# Altium schematic symbol library Semi-ATE.SchLib: 322 symbols (part 5 of 6) (continued)
## RES1A_41 (continued)
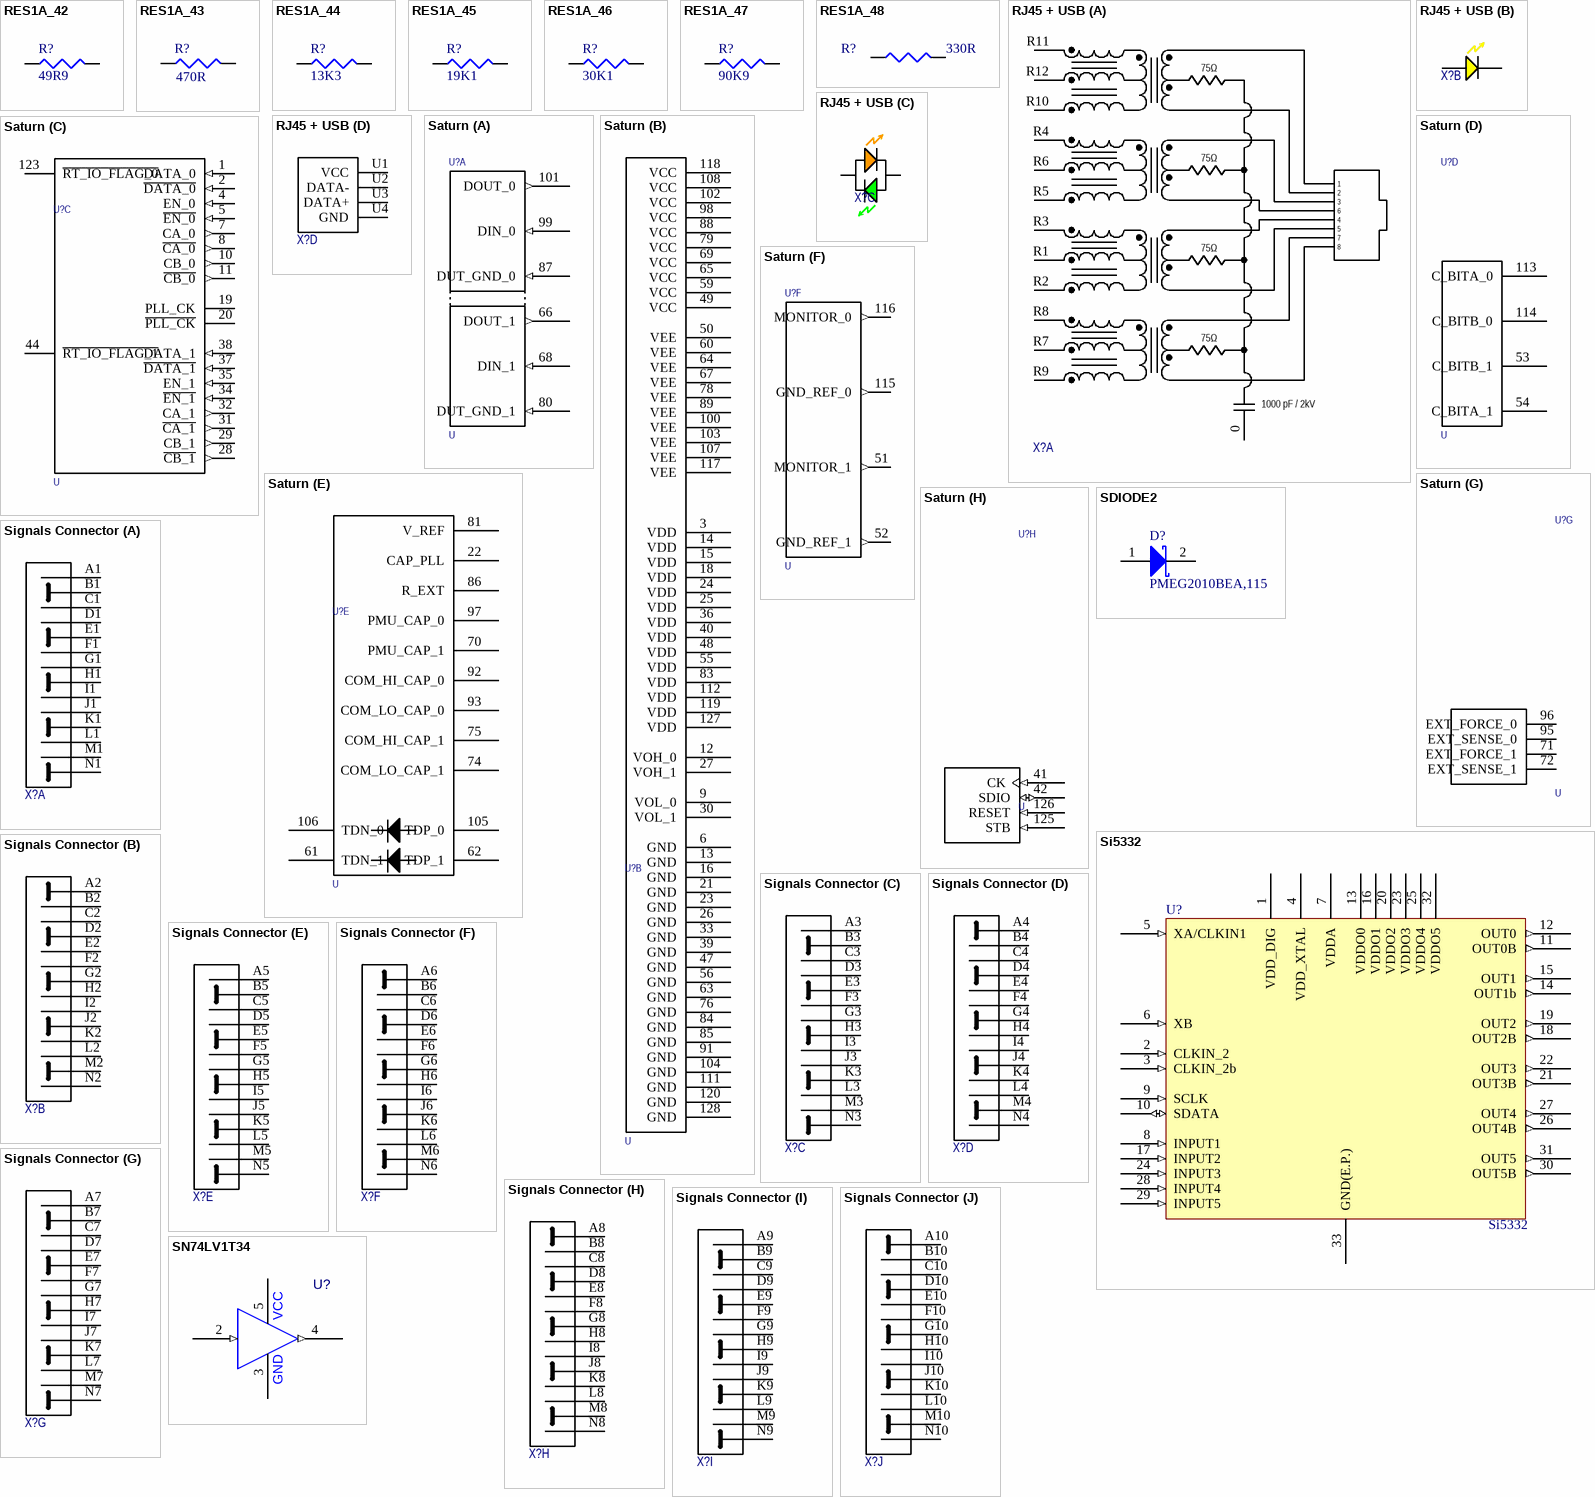
[diagram p13: symbols RES1A_42 to SN74LV1T34]

## RES1A_42
designator R?, comment value 49R9  (hidden comment: R)
RES SMD 49.9 OHM 1% 1/16W 0402; 04. Manufacturer: Yageo; 07. Manufacturer  Part Number: RC0402FR-0749R9L; POPULATED: yes; Parameters: 1/16W, 50V, 1%; 03. Unit Price: 0.09; Voltage Rating: 50V; 3D-Export: No; 01. Distributor: DigiKey; 02. Distributor Part Number: 311-49.9LRDKR-ND; 09. Operating Temperature: -55°C ~ 155°C; 11. RoHS: YES; Temperature Range: -55°C/+125°C; Power Rating: 1/16W; Tolerance: ±1%; Type: Thick Film; ComponentLink4Description: Info; ComponentLink4URL: https://www.digikey.de/product-detail/en/yageo/RC0402FR-0749R9L/311-49.9LRDKR-ND/732515; ComponentLink5Description: DataSheet; ComponentLink5URL: http://www.yageo.com/documents/recent/PYu-RC_Group_51_RoHS_L_10.pdf
footprint R0402 (Chip Resistor, Body 1.1x0.5mm (LxW typ), IPC High Density)
footprint R0603 (Chip Resistor, Body 1.6x0.8mm (LxW typ), IPC High Density)
footprint R0805 (Chip Resistor, Body 2.0x1.3mm (LxW typ), IPC High Density)
footprint R1206 (Chip Resistor, Body 3.2x1.6mm (LxW typ), IPC High Density)
footprint R1210 (Chip Resistor, Body 3.2x2.5mm (LxW typ), IPC High Density)
footprint R2010 (Chip Resistor, Body 5.0x2.5mm (LxW typ), IPC High Density)
footprint R2512 (Chip Resistor, Body 6.3x3.2mm (LxW typ), IPC High Density)
footprint R0402 Reflow
pins: 1, 2

## RES1A_43
designator R?, comment value 470R  (hidden comment: R)
RES SMD 470 OHM 1% 1/10W 0603; 04. Manufacturer: Yageo; 07. Manufacturer  Part Number: RC0603FR-07470RL; POPULATED: yes; Parameters: 1/10W, 50V, 1%; 03. Unit Price: 0.09; Voltage Rating: 50V; 3D-Export: No; 01. Distributor: DigiKey; 02. Distributor Part Number: 311-470HRDKR-ND; 09. Operating Temperature: -55°C ~ 155°C; 11. RoHS: YES; Temperature Range: -55°C/+125°C; Power Rating: 1/10W; Tolerance: ±1%; Type: Thick Film; ComponentLink4Description: Info; ComponentLink4URL: https://www.digikey.de/product-detail/en/yageo/RC0603FR-07470RL/311-470HRDKR-ND/733150; ComponentLink5Description: DataSheet; ComponentLink5URL: http://www.yageo.com/documents/recent/PYu-RC_Group_51_RoHS_L_10.pdf
footprint R0603 (Chip Resistor, Body 1.6x0.8mm (LxW typ), IPC High Density)
footprint R0603 Reflow
pins: 1, 2

## RES1A_44
designator R?, comment value 13K3  (hidden comment: R)
RES SMD 13.3K OHM 1% 1/16W 0402; 04. Manufacturer: Yageo; 07. Manufacturer  Part Number: RC0402FR-0713K3L; POPULATED: yes; Parameters: 1/16W, 50V, 1%; 03. Unit Price: 0.09; Voltage Rating: 50V; 3D-Export: No; 01. Distributor: DigiKey; 02. Distributor Part Number: YAG2974DKR-ND; 09. Operating Temperature: -55°C ~ 155°C; 11. RoHS: YES; Power Rating: 1/16W; Temperature Range: -55°C/+125°C; Tolerance: ±1%; Type: Thick Film; ComponentLink4Description: Info; ComponentLink4URL: https://www.digikey.de/product-detail/en/yageo/RC0402FR-0713K3L/YAG2974DKR-ND/5282845
footprint R0603 (Chip Resistor, Body 1.6x0.8mm (LxW typ), IPC High Density)
footprint R0402
footprint R0402 Reflow
pins: 1, 2

## RES1A_45
designator R?, comment value 19K1  (hidden comment: R)
RES SMD 19.1K OHM 1% 1/16W 0402; 04. Manufacturer: Yageo; 07. Manufacturer  Part Number: RC0402FR-0719K1L; POPULATED: yes; Parameters: 1/16W, 50V, 1%; 03. Unit Price: 0.09; Voltage Rating: 50V; 3D-Export: No; 01. Distributor: DigiKey; 02. Distributor Part Number: 311-19.1KLRDKR-ND; 09. Operating Temperature: -55°C ~ 155°C; 11. RoHS: YES; Power Rating: 1/16W; Temperature Range: -55°C/+125°C; Tolerance: ±1%; Type: Thick Film; ComponentLink4Description: Info; ComponentLink4URL: https://www.digikey.de/product-detail/en/yageo/RC0402FR-0719K1L/311-19.1KLRDKR-ND/732446
footprint R0603 (Chip Resistor, Body 1.6x0.8mm (LxW typ), IPC High Density)
footprint R0402
footprint R0402 Reflow
pins: 1, 2

## RES1A_46
designator R?, comment value 30K1  (hidden comment: R)
RES SMD 30.1K OHM 1% 1/16W 0402; 04. Manufacturer: Yageo; 07. Manufacturer  Part Number: RC0402FR-0730K1L; POPULATED: yes; Parameters: 1/16W, 50V, 1%; 03. Unit Price: 0.09; Voltage Rating: 50V; 3D-Export: No; 01. Distributor: DigiKey; 02. Distributor Part Number: 311-30.1KLRDKR-ND; 09. Operating Temperature: -55°C ~ 155°C; 11. RoHS: YES; Power Rating: 1/16W; Temperature Range: -55°C/+125°C; Tolerance: ±1%; Type: Thick Film; ComponentLink4Description: Info; ComponentLink4URL: https://www.digikey.de/product-detail/en/yageo/RC0402FR-0730K1L/311-30.1KLRDKR-ND/732481
footprint R0603 (Chip Resistor, Body 1.6x0.8mm (LxW typ), IPC High Density)
footprint R0402
footprint R0402 Reflow
pins: 1, 2

## RES1A_47
designator R?, comment value 90K9  (hidden comment: R)
RES SMD 90.9K OHM 1% 1/16W 0402; 04. Manufacturer: Yageo; 07. Manufacturer  Part Number: RC0402FR-0790K9L; POPULATED: yes; Parameters: 1/16W, 50V, 1%; 03. Unit Price: 0.09; Voltage Rating: 50V; 3D-Export: No; 01. Distributor: DigiKey; 02. Distributor Part Number: 311-90.9KLRDKR-ND; 09. Operating Temperature: -55°C ~ 155°C; 11. RoHS: YES; Power Rating: 1/16W; Temperature Range: -55°C/+125°C; Tolerance: ±1%; Type: Thick Film; ComponentLink4Description: Info; ComponentLink4URL: https://www.digikey.de/product-detail/en/yageo/RC0402FR-0790K9L/311-90.9KLRDKR-ND/732564
footprint R0603 (Chip Resistor, Body 1.6x0.8mm (LxW typ), IPC High Density)
footprint R0402
footprint R0402 Reflow
pins: 1, 2

## RES1A_48
designator R?, comment value 330R  (hidden comment: R)
RES SMD 330 OHM 1% 1/16W 0402; MFR: VISHAY; MFR-TYPE: D/CRCW e3; 04. Manufacturer: Yageo; 07. Manufacturer  Part Number: RC0402FR-07330RL; POPULATED: yes; Parameters: 1/16W, 50V, 1%; PackageHeight: 0.4mm; 03. Unit Price: 0.09; Voltage Rating: 50V; 3D-Export: No; 01. Distributor: DigiKey; 02. Distributor Part Number: 311-330LRDKR-ND; 09. Operating Temperature: -55°C ~ 155°C; 11. RoHS: YES; Power Rating: 1/16W; Temperature Range: -55°C/+125°C; Tolerance: ±1%; Type: Thick Film; ComponentLink4Description: Info; ComponentLink4URL: https://www.digikey.de/product-detail/en/yageo/RC0402FR-07330RL/311-330LRDKR-ND/732488; ComponentLink5Description: DataSheet; ComponentLink5URL: http://www.yageo.com/documents/recent/PYu-RC_Group_51_RoHS_L_10.pdf
footprint R0402 (Chip Resistor, Body 1.1x0.5mm (LxW typ), IPC High Density)
footprint R0603 (Chip Resistor, Body 1.6x0.8mm (LxW typ), IPC High Density)
footprint R0805 (Chip Resistor, Body 2.0x1.3mm (LxW typ), IPC High Density)
footprint R1206 (Chip Resistor, Body 3.2x1.6mm (LxW typ), IPC High Density)
footprint R1210 (Chip Resistor, Body 3.2x2.5mm (LxW typ), IPC High Density)
footprint R2010 (Chip Resistor, Body 5.0x2.5mm (LxW typ), IPC High Density)
footprint R2512 (Chip Resistor, Body 6.3x3.2mm (LxW typ), IPC High Density)
footprint R0402 Reflow
pins: 1, 2

## RJ45 + USB
designator X?, comment X  (value not drawn)
CONN MGJK 1PRT W/USB 1000 BASE-T; 04. Manufacturer: Amphenol Commercial Products; 07. Manufacturer  Part Number: RJMG233022610ER; 03. Unit Price: 5.06; 13. Created Date/Name: SEP 2018 / Hören; 3D-Export: Yes; 01. Distributor: DigiKey; 02. Distributor Part Number: RJMG233022610ER-ND; 09. Operating Temperature: 0°C ~ 70°C; 11. RoHS: YES; ComponentLink1Description: Info; ComponentLink1URL: https://www.digikey.de/product-detail/en/amphenol-commercial-products/RJMG233022610ER/RJMG233022610ER-ND/5359808; ComponentLink2Description: DataSheet; ComponentLink2URL: https://cdn.amphenol-icc.com/media/wysiwyg/files/documentation/datasheet/inputoutput/io_rjmag.pdf; ComponentLink4Description: Drawing; ComponentLink4URL: https://www.amphenol-icc.com/media/wysiwyg/files/drawing/rjmg233022610er.pdf
footprint RJMG233022610ER (RJ45 + USB)
part A pins: 0 GND, R1, R2, R3, R4, R5, R6, R7, R8, R9, R10, R11, R12
part B pins: L1, L2
part C pins: L3, L4
part D pins: U1 VCC, U2 DATA-, U3 DATA+, U4 GND
part A text: 75Ω; 1; 2; 3; 6; 4; 5; 7; 8; 1000 pF / 2kV

## Saturn
designator U?, comment U
Dual Channel, DCL + PMU (24V/75MHz); 04. Manufacturer: ElevATE; 07. Manufacturer  Part Number: ISL55188-AS; 03. Unit Price: 85.0; 05. Quantity: 1; 13. Created Date/Name: AUG 2018 / Hören; 3D-Export: Yes; ComponentLink1Description: Info; 01. Distributor: ElevATE; 02. Distributor Part Number: ISL55188-AS; 09. Operating Temperature: -55°C ~ 150°C; ComponentLink2Description: DataSheet
footprint Q128.14x20B
part A pins: 66 DOUT_1 (out), 68 DIN_1 (in), 80 DUT_GND_1 (in), 87 DUT_GND_0 (in), 99 DIN_0 (in), 101 DOUT_0 (out)
part B pins: 3 VDD (power), 6 GND (power), 9 VOL_0 (power), 12 VOH_0 (power), 13 GND (power), 14 VDD (power), 15 VDD (power), 16 GND (power), 18 VDD (power), 21 GND (power), 23 GND (power), 24 VDD (power), 25 VDD (power), 26 GND (power), 27 VOH_1 (power), 30 VOL_1 (power), 33 GND (power), 36 VDD (power), 39 GND (power), 40 VDD (power), 47 GND (power), 48 VDD (power), 49 VCC (power), 50 VEE (power), 55 VDD (power), 56 GND (power), 59 VCC (power), 60 VEE (power), 63 GND (power), 64 VEE (power), 65 VCC (power), 67 VEE (power), 69 VCC (power), 76 GND (power), 78 VEE (power), 79 VCC (power), 83 VDD (power), 84 GND (power), 85 GND (power), 88 VCC (power), 89 VEE (power), 91 GND (power), 98 VCC (power), 100 VEE (power), 102 VCC (power), 103 VEE (power), 104 GND (power), 107 VEE (power), 108 VCC (power), 111 GND (power), 112 VDD (power), 117 VEE (power), 118 VCC (power), 119 VDD (power), 120 GND (power), 127 VDD (power), 128 GND (power)
part C pins: 1 DATA_0 (in), 2 ~{DATA_0} (in) "DATA*_0", 4 EN_0 (in), 5 ~{EN_0} (in) "EN*_0", 7 CA_0 (out), 8 ~{CA_0} (out) "CA*_0", 10 CB_0 (out), 11 ~{CB_0} (out) "CB*_0", 19 PLL_CK, 20 ~{PLL_CK} "PLL_CK*", 28 ~{CB_1} (out) "CB*_1", 29 CB_1 (out), 31 ~{CA_1} (out) "CA*_1", 32 CA_1 (out), 34 ~{EN_1} (in) "EN*_1", 35 EN_1 (in), 37 ~{DATA_1} (in) "DATA*_1", 38 DATA_1 (in), 44 ~{RT_IO_FLAG_1} (oc) "RT_IO_FLAG*_1", 123 ~{RT_IO_FLAG_0} (oc) "RT_IO_FLAG*_0"
part D pins: 53 C_BITB_1 (oc), 54 C_BITA_1 (oc), 113 C_BITA_0 (oc), 114 C_BITB_0 (oc)
part E pins: 22 CAP_PLL, 61 TDN_1, 62 TDP_1, 70 PMU_CAP_1, 74 COM_LO_CAP_1, 75 COM_HI_CAP_1, 81 V_REF, 86 R_EXT, 92 COM_HI_CAP_0, 93 COM_LO_CAP_0, 97 PMU_CAP_0, 105 TDP_0, 106 TDN_0
part F pins: 51 MONITOR_1 (out), 52 GND_REF_1 (out), 115 GND_REF_0 (out), 116 MONITOR_0 (out)
part G pins: 71 EXT_FORCE_1, 72 EXT_SENSE_1, 95 EXT_SENSE_0, 96 EXT_FORCE_0
part H pins: 41 CK (in), 42 SDIO (io), 125 STB (in), 126 RESET (in)

## SDIODE2
designator D?, comment 07. Manufacturer  Part Number: PMEG2010BEA,115  (hidden comment: D)
DIODE SCHOTTKY 20V 1A SOD323; MFR: NXP; MFR-PN: PMEG2010BEA; 04. Manufacturer: Nexperia USA Inc.; POPULATED: yes; 03. Unit Price: 0.35; 3D-Export: No; 01. Distributor: DigiKey; 02. Distributor Part Number: 1727-5823-6-ND; 09. Operating Temperature: -65°C ~ 150°C; 11. RoHS: YES; ComponentLink4Description: Info; ComponentLink4URL: https://www.digikey.de/products/en/discrete-semiconductor-products/diodes-rectifiers-single/280?k=PMEG2010BEA&k=&pkeyword=PMEG2010BEA&sv=0&pv7=243&sf=0&quantity=&ColumnSort=0&page=1&pageSize=25; ComponentLink5Description: DataSheet; ComponentLink5URL: https://assets.nexperia.com/documents/data-sheet/PMEGXX10BEA_PMEGXX10BEV.pdf
footprint SOD323 (Footprint not found)
pins: 1 A, 2 K

## Si5332
designator U?, comment NicName: Si5332  (hidden comment: U)
IC CLK GENERATION (Any-Frequency Clock Generator) 32QFN; MFR-PN: Si5332E-D-GM1; MFR: SiLabs; 04. Manufacturer: Silicon Labs; POPULATED: yes; 03. Unit Price: 9.36; 3D-Export: No; 01. Distributor: MOUSER; 02. Distributor Part Number: 634-SI5332E-D-GM1; 07. Manufacturer  Part Number: Si5332E-D-GM1; 09. Operating Temperature: -40°C ~ 85°C; 11. RoHS: YES; ComponentLink4Description: Info; ComponentLink4URL: https://www.digikey.de/products/en/integrated-circuits-ics/clock-timing-clock-buffers-drivers/764?k=Si53340-B-GM&k=&pkeyword=Si53340-B-GM&sv=0&pv7=243&sf=0&quantity=&ColumnSort=0&page=1&pageSize=25; ComponentLink5Description: DataSheet; ComponentLink5URL: https://www.silabs.com/documents/public/data-sheets/si5334x-datasheet.pdf
footprint Silabs-QFN32 (Footprint not found)
pins: 1 VDD_DIG (power), 2 CLKIN_2 (in), 3 CLKIN_2b (in), 4 VDD_XTAL (power), 5 XA/CLKIN1 (in), 6 XB (in), 7 VDDA (power), 8 INPUT1 (in), 9 SCLK (in), 10 SDATA (io), 11 OUT0B (out), 12 OUT0 (out), 13 VDDO0 (power), 14 OUT1b (out), 15 OUT1 (out), 16 VDDO1 (power), 17 INPUT2 (in), 18 OUT2B (out), 19 OUT2 (out), 20 VDDO2 (power), 21 OUT3B (out), 22 OUT3 (out), 23 VDDO3 (power), 24 INPUT3 (in), 25 VDDO4 (power), 26 OUT4B (out), 27 OUT4 (out), 28 INPUT4 (in), 29 INPUT5 (in), 30 OUT5B (out), 31 OUT5 (out), 32 VDDO5 (power), 33 GND(E.P.) (power)

## Signals Connector
designator X?, comment X  (value not drawn)
CONN RCPT EXAMAX 80POS PCB; 04. Manufacturer: Samtec Inc.; 07. Manufacturer  Part Number: EBTF-4-10-2.0-S-RA-1; 03. Unit Price: 17.95; 13. Created Date/Name: AUG 2018 / Hören; System: Connector; 3D-Export: Yes; 01. Distributor: Samtec Inc.; 02. Distributor Part Number: EBTF-4-10-2.0-S-RA-1; 11. RoHS: YES; ComponentLink1Description: Info; ComponentLink1URL: https://www.samtec.com/products/ebtf-4-10-2.0-s-ra-1; ComponentLink2Description: DataSheet; ComponentLink2URL: http://suddendocs.samtec.com/catalog_english/ebtf-ra.pdf
footprint EBTF-4-10-2.0-S-RA-1 (Signals MaxiSCT (SCT8 side))
footprint EBTM-4-10-2.0-S-VT-1 (Signals MaxiSCT (Backplane side))
part A pins: A1, B1, C1, D1, E1, F1, G1, H1, I1, J1, K1, L1, M1, N1
part B pins: A2, B2, C2, D2, E2, F2, G2, H2, I2, J2, K2, L2, M2, N2
part C pins: A3, B3, C3, D3, E3, F3, G3, H3, I3, J3, K3, L3, M3, N3
part D pins: A4, B4, C4, D4, E4, F4, G4, H4, I4, J4, K4, L4, M4, N4
part E pins: A5, B5, C5, D5, E5, F5, G5, H5, I5, J5, K5, L5, M5, N5
part F pins: A6, B6, C6, D6, E6, F6, G6, H6, I6, J6, K6, L6, M6, N6
part G pins: A7, B7, C7, D7, E7, F7, G7, H7, I7, J7, K7, L7, M7, N7
part H pins: A8, B8, C8, D8, E8, F8, G8, H8, I8, J8, K8, L8, M8, N8
part I pins: A9, B9, C9, D9, E9, F9, G9, H9, I9, J9, K9, L9, M9, N9
part J pins: A10, B10, C10, D10, E10, F10, G10, H10, I10, J10, K10, L10, M10, N10

## SN74LV1T34
designator U?, comment U  (value not drawn)
Single Power Supply Single Buffer GATE CMOS Logic Level Shifter; 04. Manufacturer: Texas Instruments; 07. Manufacturer  Part Number: SN74LV1T34DBVR; 03. Unit Price: 0.43; 05. Quantity: 1; 13. Created Date/Name: 10.04.19 M. Moerz; 3D-Export: No; 01. Distributor: Digi-Key; 02. Distributor Part Number: 296-37176-1-ND; ComponentLink1Description: Hersteller Link; ComponentLink1URL: https://www.nexperia.com/
footprint SOT-23-5 (SOT25, SOT753, MO-178AA, SC-74A, SMT5; 5 Leads; Pitch 0.95mm; Body 3.1 x 3 mm, inc. leads (LxW max))
pins: 2 A (in), 3 GND (power), 4 Y (out), 5 VCC (power)

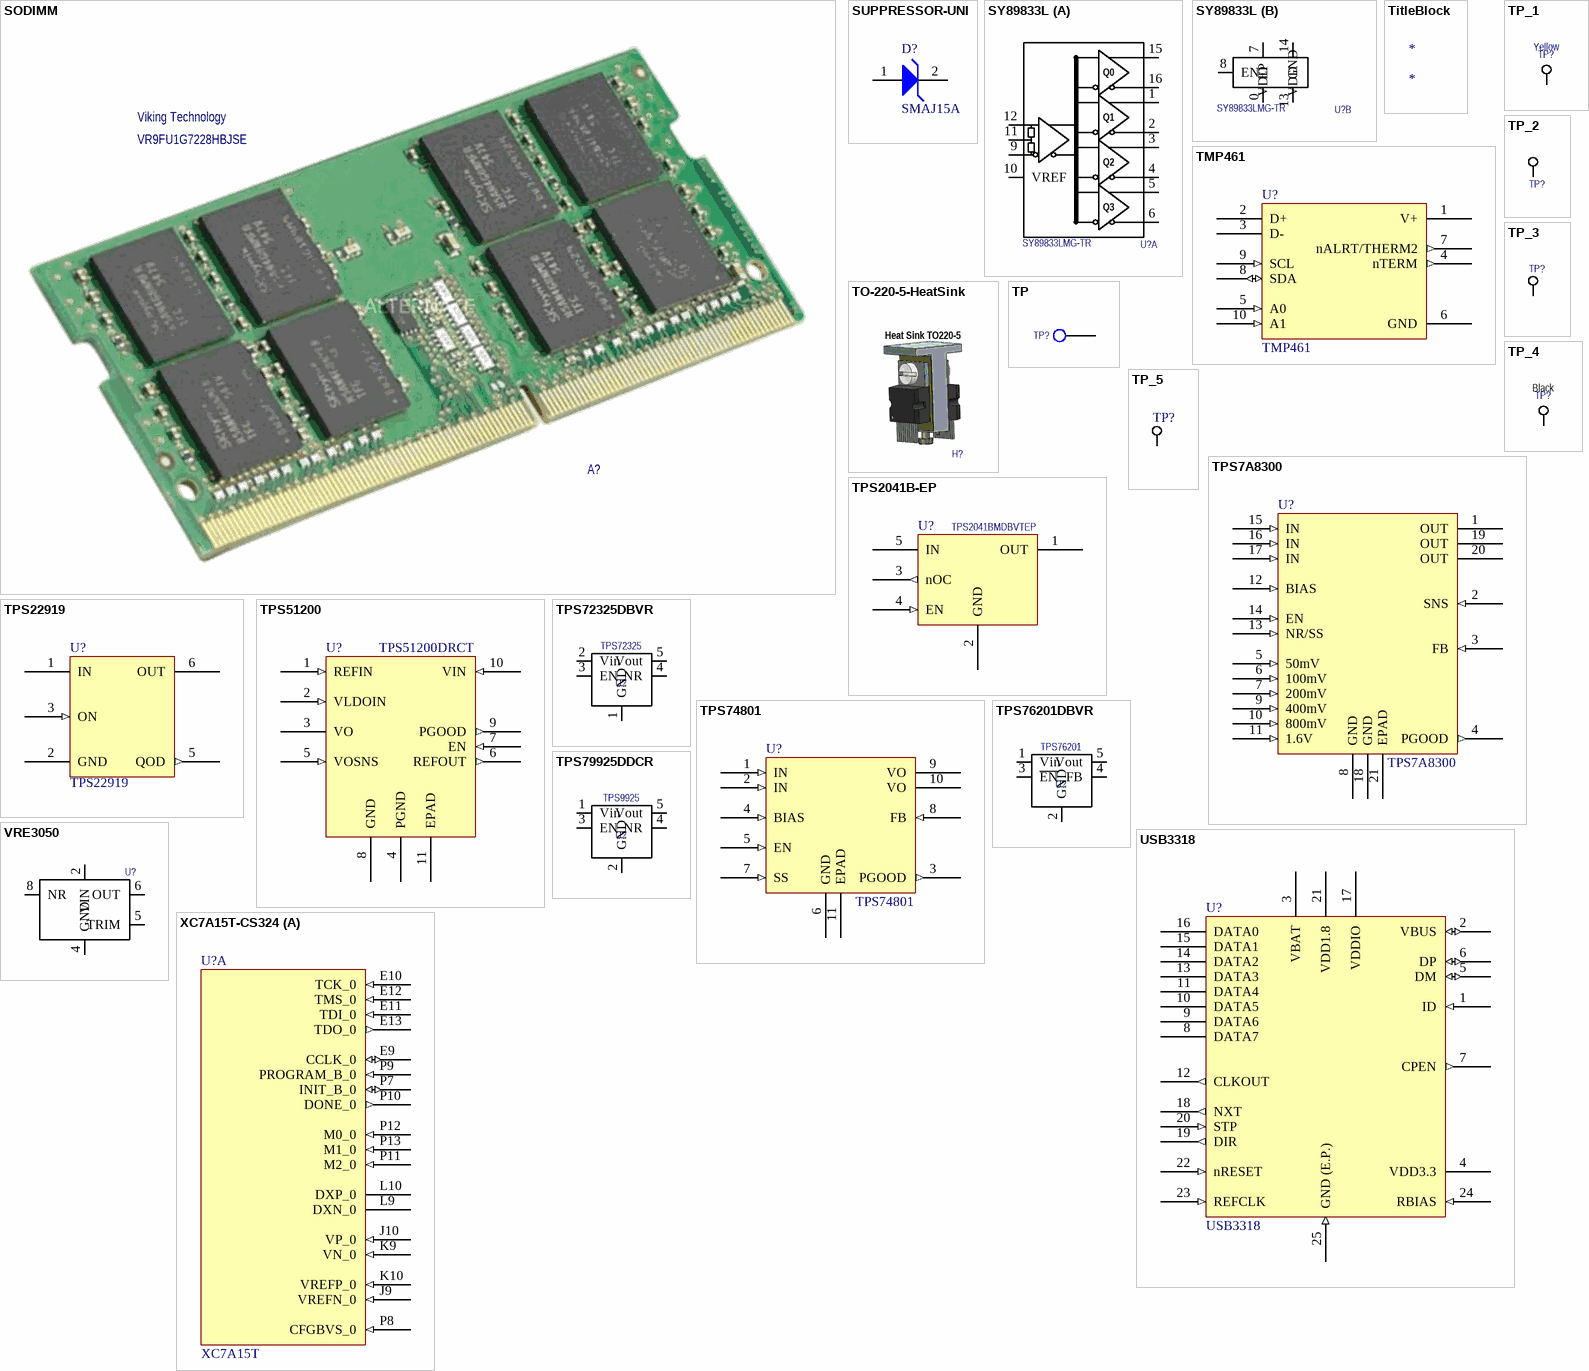
[diagram p14: symbols SODIMM to XC7A15T-CS324]

## SODIMM
designator A?, comment 04. Manufacturer: Viking Technology  07. Manufacturer  Part Number: VR9FU1G7228HBJSE  (hidden comment: A)
DDR4 8GB ECC SODIMM; 03. Unit Price: 190.38; 13. Created Date/Name: APR 2019 / Hören; 3D-Export: No; 01. Distributor: DigiKey; 02. Distributor Part Number: 1803-1060-ND; 11. RoHS: YES; ComponentLink1Description: Info; ComponentLink1URL: https://www.digikey.de/products/en/memory-cards-modules/memory-modules/505?k=SODIMM+260&k=&pkeyword=SODIMM+260&sv=0&pv143=489&sf=0&FV=ffe001f9%2Cfffc070b&quantity=&ColumnSort=0&page=1&pageSize=25; ComponentLink2Description: DataSheet; ComponentLink2URL: http://www.vikingtechnology.com/wp-content/uploads/Viking_MemorySolutions_Brochure_LowRes.pdf
footprint SODIMM (Generic 260 Pin SODIMM)

## SUPPRESSOR-UNI
designator D?, comment 07. Manufacturer  Part Number: SMAJ15A  (hidden comment: D)
TVS DIODE 15V 24.4V DO214AC; MFR: Littlefuse; 04. Manufacturer: Littelfuse Inc.; POPULATED: yes; 03. Unit Price: 0.37; 3D-Export: No; MFR-PN: SMAJ15A; 01. Distributor: DigiKey; 02. Distributor Part Number: SMAJ15ALFDKR-ND; 09. Operating Temperature: -65°C ~ 150°C (TJ); 11. RoHS: YES; ComponentLink4Description: Info; ComponentLink4URL: https://www.digikey.de/products/en/circuit-protection/tvs-diodes/144?k=SMAJ15A&k=&pkeyword=SMAJ15A&sv=0&v=18&sf=0&FV=1c00f3%2Cffe00090%2C1f140000&quantity=&ColumnSort=0&page=1&pageSize=25; ComponentLink5Description: DataSheet; ComponentLink5URL: https://www.littelfuse.com/~/media/electronics/datasheets/tvs_diodes/littelfuse_tvs_diode_smaj_datasheet.pdf.pdf
footprint SMA
footprint SMB
footprint SMC
pins: 1 A, 2 K

## SY89833L
designator U?, comment 07. Manufacturer  Part Number: SY89833LMG-TR  (hidden comment: U)
IC CLK BUFFER 1:4 2GHZ 16MLF; 04. Manufacturer: Microchip Technology; 03. Unit Price: 5.22; 13. Created Date/Name: AUG 2018 / Hören; 3D-Export: No; 01. Distributor: DigiKey; 02. Distributor Part Number: SY89833LMG-DKR-ND; 09. Operating Temperature: -40°C ~ 85°C; 11. RoHS: YES; ComponentLink1Description: Info; ComponentLink1URL: https://www.digikey.de/product-detail/en/microchip-technology/SY89833LMG-TR/SY89833LMG-DKR-ND/7897250; ComponentLink2Description: DataSheet; ComponentLink2URL: http://ww1.microchip.com/downloads/en/DeviceDoc/sy89833l.pdf; Package: VFQFN16
footprint QFN16-3x3-4x4-EP (3x3mm, 4x4=16 leads QFN with Exposed Pad)
part A pins: 1 Q1, 2 ~{Q1}, 3 Q2, 4 ~{Q2}, 5 Q3, 6 ~{Q3}, 9 ~{IN}, 10 VREF, 11 VT, 12 IN, 15 Q0, 16 ~{Q0}
part B pins: 0 EP, 7 VDD, 8 EN, 13 GND, 14 VDD

## TitleBlock
designator *

## TMP461
designator U?, comment NicName: TMP461  (hidden comment: U)
SENSOR DIGITAL -40C-125C 10QFN; MFR: TEXAS INSTRUMENTS; 07. Manufacturer  Part Number: TMP461AIRUNR; POPULATED: yes; 03. Unit Price: 1.81; 3D-Export: No; MFR-PN: TMP461; Temperature Range: -40°C/+125°C; 01. Distributor: DigiKey; 02. Distributor Part Number: 296-48719-6-ND; 04. Manufacturer: Texas Instruments; 09. Operating Temperature: -40°C ~ 125°C; 11. RoHS: YES; ComponentLink4Description: Info; ComponentLink4URL: https://www.digikey.de/products/en/sensors-transducers/temperature-sensors-analog-and-digital-output/518?k=TMP461&k=&pkeyword=TMP461&sv=0&pv7=243&sf=0&FV=ffe00206%2C402f7f&quantity=&ColumnSort=0&page=1&pageSize=25; ComponentLink5Description: DataSheet; ComponentLink5URL: http://www.ti.com/general/docs/suppproductinfo.tsp?distId=10&gotoUrl=http%3A%2F%2Fwww.ti.com%2Flit%2Fgpn%2Ftmp461
footprint TI-WQFN10 (Footprint not found)
pins: 1 V+, 2 D+, 3 D-, 4 nTERM (out), 5 A0 (in), 6 GND (power), 7 nALRT/THERM2 (out), 8 SDA (io), 9 SCL (in), 10 A1 (in)

## TO-220-5-HeatSink
designator H?, comment H  (value not drawn)
HEATSINK TO-220-5 Standing 22mm; 04. Manufacturer: TBD; 03. Unit Price: 1; 13. Created Date/Name: AUG 2018 / Hören; Design: AWGDIG; 3D-Export: Yes; 01. Distributor: N/A; 02. Distributor Part Number: N/A; 07. Manufacturer  Part Number: TBD; 11. RoHS: N/A; ComponentLink1Description: Info; ComponentLink2Description: DataSheet
footprint TO-220-5-Standing Heatsink
text: Heat Sink TO220-5

## TP
designator TP?  (value not drawn)  (no BOM)
Test Point; POPULATED: no part; 3D-Export: No
footprint TP
pins: 1

## TP_1
designator TP?, comment Color: Yellow  (hidden comment: TP)  (no BOM)
Test Pin/Pad; 04. Manufacturer: Keystone Electronics; 07. Manufacturer  Part Number: 5004; 03. Unit Price: 0.31; 13. Created Date/Name: AUG2018/Hören; 3D-Export: No; 02. Distributor Part Number: 36-5004-ND; 11. RoHS: YES; ComponentLink1Description: Info; ComponentLink1URL: https://www.digikey.de/products/en?keywords=36-5004-ND; ComponentLink2Description: DataSheet; ComponentLink2URL: http://www.keyelco.com/product-pdf.cfm?p=1313
footprint TP-Oval-Black
footprint TP-Oval-Blue
footprint TP-Oval-Green
footprint TP-Oval-Orange
footprint TP-Round-Red
footprint TP-Oval-White
footprint TP-Oval-Yellow
footprint TP-Oval-Red
footprint TP-Round-Black (Black Circular Test Point)
footprint TP-Round-Blue
footprint TP-Round-Green
footprint TP-Round-Orange
footprint TP-Round-White
footprint TP-Round-Yellow
footprint TP-SMD
footprint TP-Probe-0.7 (Test Point 0.8 mm hole for Probe)
footprint TP-Probe-0.8 (Test Point 0.8 mm hole for Probe)
footprint TP-POGO-1mm
pins: 0

## TP_2
designator TP?, comment TP  (value not drawn)  (no BOM)
Test Pin/Pad; 03. Unit Price: 0.0; 13. Created Date/Name: AUG2018/Hören; Design: AWGDIG; 3D-Export: No; 02. Distributor Part Number: N/A; 04. Manufacturer: N/A; 07. Manufacturer  Part Number: N/A; 09. Operating Temperature: N/A; 11. RoHS: YES; 01. Distributor: N/A; ComponentLink1Description: Info; ComponentLink2Description: DataSheet
footprint TP-Oval-Black
footprint TP-Oval-Blue
footprint TP-Oval-Green
footprint TP-Oval-Orange
footprint TP-Round-Red
footprint TP-Oval-White
footprint TP-Oval-Yellow
footprint TP-Oval-Red
footprint TP-Round-Black (Black Circular Test Point)
footprint TP-Round-Blue
footprint TP-Round-Green
footprint TP-Round-Orange
footprint TP-Round-White
footprint TP-Round-Yellow
footprint TP-SMD
footprint TP-Probe-0.7 (Test Point 0.8 mm hole for Probe)
footprint TP-Probe-0.8 (Test Point 0.8 mm hole for Probe)
pins: 0

## TP_3
designator TP?, comment TP  (value not drawn)  (no BOM)
Test Pin/Pad; 03. Unit Price: 0.0; 13. Created Date/Name: AUG2018/Hören; 3D-Export: No; 02. Distributor Part Number: N/A; 04. Manufacturer: N/A; 07. Manufacturer  Part Number: N/A; 11. RoHS: YES; 01. Distributor: N/A; ComponentLink1Description: Info; ComponentLink2Description: DataSheet
footprint TP-Oval-Black
footprint TP-Oval-Blue
footprint TP-Oval-Green
footprint TP-Oval-Orange
footprint TP-Round-Red
footprint TP-Oval-White
footprint TP-Oval-Yellow
footprint TP-Oval-Red
footprint TP-Round-Black (Black Circular Test Point)
footprint TP-Round-Blue
footprint TP-Round-Green
footprint TP-Round-Orange
footprint TP-Round-White
footprint TP-Round-Yellow
footprint TP-SMD
footprint TP-Probe-0.7 (Test Point 0.8 mm hole for Probe)
footprint TP-Probe-0.8 (Test Point 0.8 mm hole for Probe)
footprint TP-POGO-1mm
pins: 0

## TP_4
designator TP?, comment Color: Black  (hidden comment: TP)
TP Oval Black; 04. Manufacturer: Keystone Electronics; 07. Manufacturer  Part Number: 5011; 03. Unit Price: 0.31; 13. Created Date/Name: AUG2018/Hören; 3D-Export: No; 02. Distributor Part Number: 36-5011-ND; 11. RoHS: YES; 01. Distributor: DigiKey; ComponentLink1Description: Info; ComponentLink2Description: DataSheet
footprint TP-Oval-Black
footprint TP-Oval-Blue
footprint TP-Oval-Green
footprint TP-Oval-Orange
footprint TP-Round-Red
footprint TP-Oval-White
footprint TP-Oval-Yellow
footprint TP-Oval-Red
footprint TP-Round-Black (Black Circular Test Point)
footprint TP-Round-Blue
footprint TP-Round-Green
footprint TP-Round-Orange
footprint TP-Round-White
footprint TP-Round-Yellow
footprint TP-SMD
footprint TP-Probe-0.7 (Test Point 0.8 mm hole for Probe)
footprint TP-Probe-0.8 (Test Point 0.8 mm hole for Probe)
footprint TP-POGO-1mm
pins: 0

## TP_5
designator TP?, comment TP  (value not drawn)  (no BOM)
Test Pin/Pad; 03. Unit Price: 0.0; 13. Created Date/Name: AUG2018/Hören; 3D-Export: No; 02. Distributor Part Number: N/A; 04. Manufacturer: N/A; 07. Manufacturer  Part Number: N/A; 09. Operating Temperature: -xx..+yy°C; 11. RoHS: ???; 01. Distributor: N/A; ComponentLink1Description: Info; ComponentLink2Description: DataSheet
footprint TP-Oval-Black
footprint TP-Oval-Blue
footprint TP-Oval-Green
footprint TP-Oval-Orange
footprint TP-Round-Red
footprint TP-Oval-White
footprint TP-Oval-Yellow
footprint TP-Oval-Red
footprint TP-Round-Black (Black Circular Test Point)
footprint TP-Round-Blue
footprint TP-Round-Green
footprint TP-Round-Orange
footprint TP-Round-White
footprint TP-Round-Yellow
footprint TP-SMD
footprint TP-Probe-0.7 (Test Point 0.8 mm hole for Probe)
footprint TP-Probe-0.8 (Test Point 0.8 mm hole for Probe)
pins: 0

## TPS7A8300
designator U?, comment NicName: TPS7A8300  (hidden comment: U)
IC REG LINEAR POS ADJ 2A 20VQFN; MFR-PN: TPS7A8300RGRT; MFR: TI; 04. Manufacturer: Texas Instruments; 07. Manufacturer  Part Number: TPS7A8300RGWT; POPULATED: yes; 03. Unit Price: 5.40; 3D-Export: No; 01. Distributor: DigiKey; 02. Distributor Part Number: 296-36510-6-ND; 09. Operating Temperature: -40°C ~ 125°C (TJ); 11. RoHS: YES; ComponentLink4Description: info; ComponentLink4URL: https://www.digikey.de/products/en/integrated-circuits-ics/pmic-voltage-regulators-linear/699?k=TPS7A8300RGWT&k=&pkeyword=TPS7A8300RGWT&sv=0&pv7=243&sf=0&quantity=&ColumnSort=0&page=1&pageSize=25; ComponentLink5Description: DataSheet; ComponentLink5URL: http://www.ti.com/general/docs/suppproductinfo.tsp?distId=10&gotoUrl=http%3A%2F%2Fwww.ti.com%2Flit%2Fgpn%2Ftps7a8300
footprint S-PVQFN-N20
pins: 1 OUT (hiz), 2 SNS (in), 3 FB (in), 4 PGOOD (out), 5 50mV (in), 6 100mV (in), 7 200mV (in), 8 GND (power), 9 400mV (in), 10 800mV (in), 11 1.6V (in), 12 BIAS (in), 13 NR/SS (in), 14 EN (in), 15 IN (in), 16 IN (in), 17 IN (in), 18 GND (power), 19 OUT (hiz), 20 OUT (hiz), 21 EPAD

## TPS2041B-EP
designator U?, comment 07. Manufacturer  Part Number: TPS2041BMDBVTEP  (hidden comment: U)
IC PWR DISTR SWITCH SOT23-5; MFR: Texas Instruments; STUFFED: yes; 03. Unit Price: 3.63; NicName: TPS2041; 3D-Export: No; MFR-PN: TPS2041BMDBVTEP; 01. Distributor: DigiKey; 02. Distributor Part Number: 296-29758-6-ND; 04. Manufacturer: Texas Instruments; 09. Operating Temperature: -55°C ~ 125°C (TJ); ComponentLink4Description: Info; ComponentLink4URL: https://www.digikey.de/products/en/integrated-circuits-ics/pmic-power-distribution-switches-load-drivers/726?k=TPS2041BMDBVTEP&k=&pkeyword=TPS2041BMDBVTEP&sv=0&pv7=243&sf=0&quantity=&ColumnSort=0&page=1&pageSize=25; ComponentLink5Description: DataSheet; ComponentLink5URL: http://www.ti.com/general/docs/suppproductinfo.tsp?distId=10&gotoUrl=http%3A%2F%2Fwww.ti.com%2Flit%2Fgpn%2Ftps2041b-ep
footprint SOT23-5_2
pins: 1 OUT (hiz), 2 GND (power), 3 nOC (out), 4 EN (in), 5 IN (power)

## TPS22919
designator U?, comment NicName: TPS22919  (hidden comment: U)
Power Switch/Driver 1:1 N-Channel 1.5A SC-70-6; MFR-PN: TPS22919DCKR; MFR: Texas Instruments; POPULATED: yes; 03. Unit Price: 0.41; 3D-Export: No; 01. Distributor: Mouser; 02. Distributor Part Number: 296-TPS22919DCKRDKR-ND; 04. Manufacturer: Texas Instruments; 07. Manufacturer  Part Number: TPS22919DCKR; 09. Operating Temperature: -40°C ~ 125°C (TA); 11. RoHS: YES; ComponentLink4Description: Info; ComponentLink4URL: https://www.digikey.de/product-detail/en/texas-instruments/TPS22919DCKR/296-TPS22919DCKRDKR-ND/10434964; ComponentLink5Description: DataSheet; ComponentLink5URL: http://www.ti.com/lit/ds/symlink/tps22919.pdf
footprint TI-SC70-6 (SC70, 6-Leads, Body 2.00x2.10mm, Pitch 0.65mm, IPC High Density)
pins: 1 IN (power), 2 GND (power), 3 ON (in), 5 QOD (out), 6 OUT (hiz)

## TPS51200
designator U?, comment 07. Manufacturer  Part Number: TPS51200DRCT  (hidden comment: U)
IC REG SINK/SOURCE DDR 10-SON; MFR: TI; 04. Manufacturer: Texas Instruments; POPULATED: yes; 03. Unit Price: 0.89; 3D-Export: No; MFR-PN: TPS51200DRCT; 01. Distributor: DigiKey; 02. Distributor Part Number: 296-23830-6-ND; 09. Operating Temperature: -40°C ~ 85°C; 11. RoHS: YES; ComponentLink4Description: Info; ComponentLink4URL: https://www.digikey.de/product-detail/en/texas-instruments/TPS51200DRCT/296-23830-6-ND/1958788; ComponentLink5Description: DataSheet; ComponentLink5URL: http://www.ti.com/lit/ds/symlink/tps51200.pdf
footprint PVSN10
pins: 1 REFIN (in), 2 VLDOIN (in), 3 VO (hiz), 4 PGND (power), 5 VOSNS (in), 6 REFOUT (out), 7 EN (in), 8 GND (power), 9 PGOOD (out), 10 VIN (in), 11 EPAD

## TPS72325DBVR
designator U?, comment NicName: TPS72325  (hidden comment: U)
IC REG LIN -2.5V 200MA SOT23-5; 04. Manufacturer: Texas Instruments; 07. Manufacturer  Part Number: TPS72325DBVR; 03. Unit Price: 2.51; 13. Created Date/Name: AUG 2018 / Hören; 3D-Export: No; 01. Distributor: DigiKey; 02. Distributor Part Number: 296-39479-1-ND; 09. Operating Temperature: -40°C ~ 125°C; 11. RoHS: YES; ComponentLink1Description: Info; ComponentLink1URL: https://www.digikey.de/products/en?keywords=296-39479-1-ND; ComponentLink2Description: DataSheet; ComponentLink2URL: http://www.ti.com/general/docs/suppproductinfo.tsp?distId=10&gotoUrl=http%3A%2F%2Fwww.ti.com%2Flit%2Fgpn%2Ftps723; Package: SOT23-5
footprint SOT23-5 (SOT 23 5 lead)
pins: 1 GND, 2 Vin, 3 EN, 4 NR, 5 Vout

## TPS74801
designator U?, comment NicName: TPS74801  (hidden comment: U)
IC REG LIN POS ADJ 1.5A 10VSON; MFR-PN: TPS74801DRCT; MFR: TI; 04. Manufacturer: Texas Instruments; POPULATED: yes; 03. Unit Price: 2.18; 3D-Export: No; 01. Distributor: DigiKey; 02. Distributor Part Number: 296-27072-6-ND; 07. Manufacturer  Part Number: TPS74801DRCT; 09. Operating Temperature: -40°C ~ 125°C; 11. RoHS: YES; ComponentLink4Description: Info; ComponentLink4URL: https://www.digikey.de/products/en/integrated-circuits-ics/pmic-voltage-regulators-linear/699?k=TPS74801DRCT&k=&pkeyword=TPS74801DRCT&sv=0&pv7=243&sf=0&quantity=&ColumnSort=0&page=1&pageSize=25; ComponentLink5Description: DataSheet; ComponentLink5URL: http://www.ti.com/general/docs/suppproductinfo.tsp?distId=10&gotoUrl=http%3A%2F%2Fwww.ti.com%2Flit%2Fgpn%2Ftps74801
footprint PVSN10 (Footprint not found)
pins: 1 IN (in), 2 IN (in), 3 PGOOD (out), 4 BIAS (in), 5 EN (in), 6 GND (power), 7 SS (in), 8 FB (in), 9 VO (hiz), 10 VO (hiz), 11 EPAD

## TPS76201DBVR
designator U?, comment NicName: TPS76201  (hidden comment: U)
IC REG LIN POS ADJ 100MA SOT23-5; 04. Manufacturer: Texas Instruments; 07. Manufacturer  Part Number: TPS76201DBVR; 03. Unit Price: 1.13; 13. Created Date/Name: AUG 2018 / Hören; 3D-Export: No; 01. Distributor: DigiKey; 02. Distributor Part Number: 296-11013-1-ND; 09. Operating Temperature: -40°C ~ 125°C; 11. RoHS: YES; ComponentLink1Description: Info; ComponentLink1URL: https://www.digikey.de/products/en?keywords=296-11013-1-ND; ComponentLink2Description: DataSheet; ComponentLink2URL: http://www.ti.com/lit/ds/symlink/tps76201.pdf; Package: SOT23-5
footprint SOT23-5 (SOT 23 5 lead)
pins: 1 Vin, 2 GND, 3 ~{EN}, 4 FB, 5 Vout

## TPS79925DDCR
designator U?, comment NicName: TPS9925  (hidden comment: U)
IC REG LINEAR 2.5V 200MA SOT23-5; 04. Manufacturer: Texas Instruments; 07. Manufacturer  Part Number: TPS79925DDCR; 03. Unit Price: 0.75; 13. Created Date/Name: AUG 2018 / Hören; 3D-Export: No; 01. Distributor: DigiKey; 02. Distributor Part Number: 296-39499-6-ND; 09. Operating Temperature: -40°C ~ 125°C; 11. RoHS: YES; ComponentLink1Description: Info; ComponentLink1URL: https://www.digikey.de/product-detail/en/texas-instruments/TPS79925DDCR/296-39499-6-ND/5143989; ComponentLink2Description: DataSheet; ComponentLink2URL: http://www.ti.com/general/docs/suppproductinfo.tsp?distId=10&gotoUrl=http%3A%2F%2Fwww.ti.com%2Flit%2Fgpn%2Ftps799; Package: SOT23-5
footprint SOT23-5 (SOT 23 5 lead)
pins: 1 Vin, 2 GND, 3 EN, 4 NR, 5 Vout

## USB3318
designator U?, comment NickName: USB3318  (hidden comment: U)
IC TXRX USB 2.0 FLEXPWR 24QFN; 04. Manufacturer: Microchip Technology; 07. Manufacturer  Part Number: USB3318-CP-TR; 03. Unit Price: 1.14; 13. Created Date/Name: ??? / Moerz; 14. Modification Date/Name: AUG 2018 / Hören; 3D-Export: No; 01. Distributor: DigiKey; 02. Distributor Part Number: 638-1064-6-ND; 09. Operating Temperature: -40°C ~ 85°C; 11. RoHS: YES; ComponentLink1Description: Info; ComponentLink2Description: DataSheet
footprint SMSC-QFN24-4mmx4mm (QFN, 24-Leads, Body 4.00x4.00mm, Pitch 0.50mm, Thermal Pad 2.50x2.50mm, IPC High Density)
pins: 1 ID (in), 2 VBUS (io), 3 VBAT (power), 4 VDD3.3 (power), 5 DM (io), 6 DP (io), 7 CPEN (out), 8 DATA7 (hiz), 9 DATA6 (hiz), 10 DATA5 (hiz), 11 DATA4 (hiz), 12 CLKOUT (out), 13 DATA3 (hiz), 14 DATA2 (hiz), 15 DATA1 (hiz), 16 DATA0 (hiz), 17 VDDIO (power), 18 NXT (out), 19 DIR (out), 20 STP (in), 21 VDD1.8 (power), 22 nRESET (in), 23 REFCLK (in), 24 RBIAS (in), 25 GND (E.P.) (in)

## VRE3050
designator U?, comment U  (value not drawn)
IC VREF SERIES 5V 8SMT; 04. Manufacturer: Apex Microtechnology; 07. Manufacturer  Part Number: VRE3050JS; 03. Unit Price: 130.83; 13. Created Date/Name: AUG 2018 / Hören; NicName: VRE3050; 3D-Export: No; 01. Distributor: DigiKey; 02. Distributor Part Number: 1240-1002-5-ND; 09. Operating Temperature: -40°C ~ 85°C (TA); 11. RoHS: YES; ComponentLink1Description: Info; ComponentLink1URL: https://www.digikey.de/products/en?keywords=1240-1002-5-ND; ComponentLink2Description: DataSheet; ComponentLink2URL: https://www.apexanalog.com/resources/products/vre3050ds.pdf
footprint GF (APEX 8-pin Surface Mount DIP)
pins: 2 VIN, 4 GND, 5 TRIM, 6 OUT, 8 NR

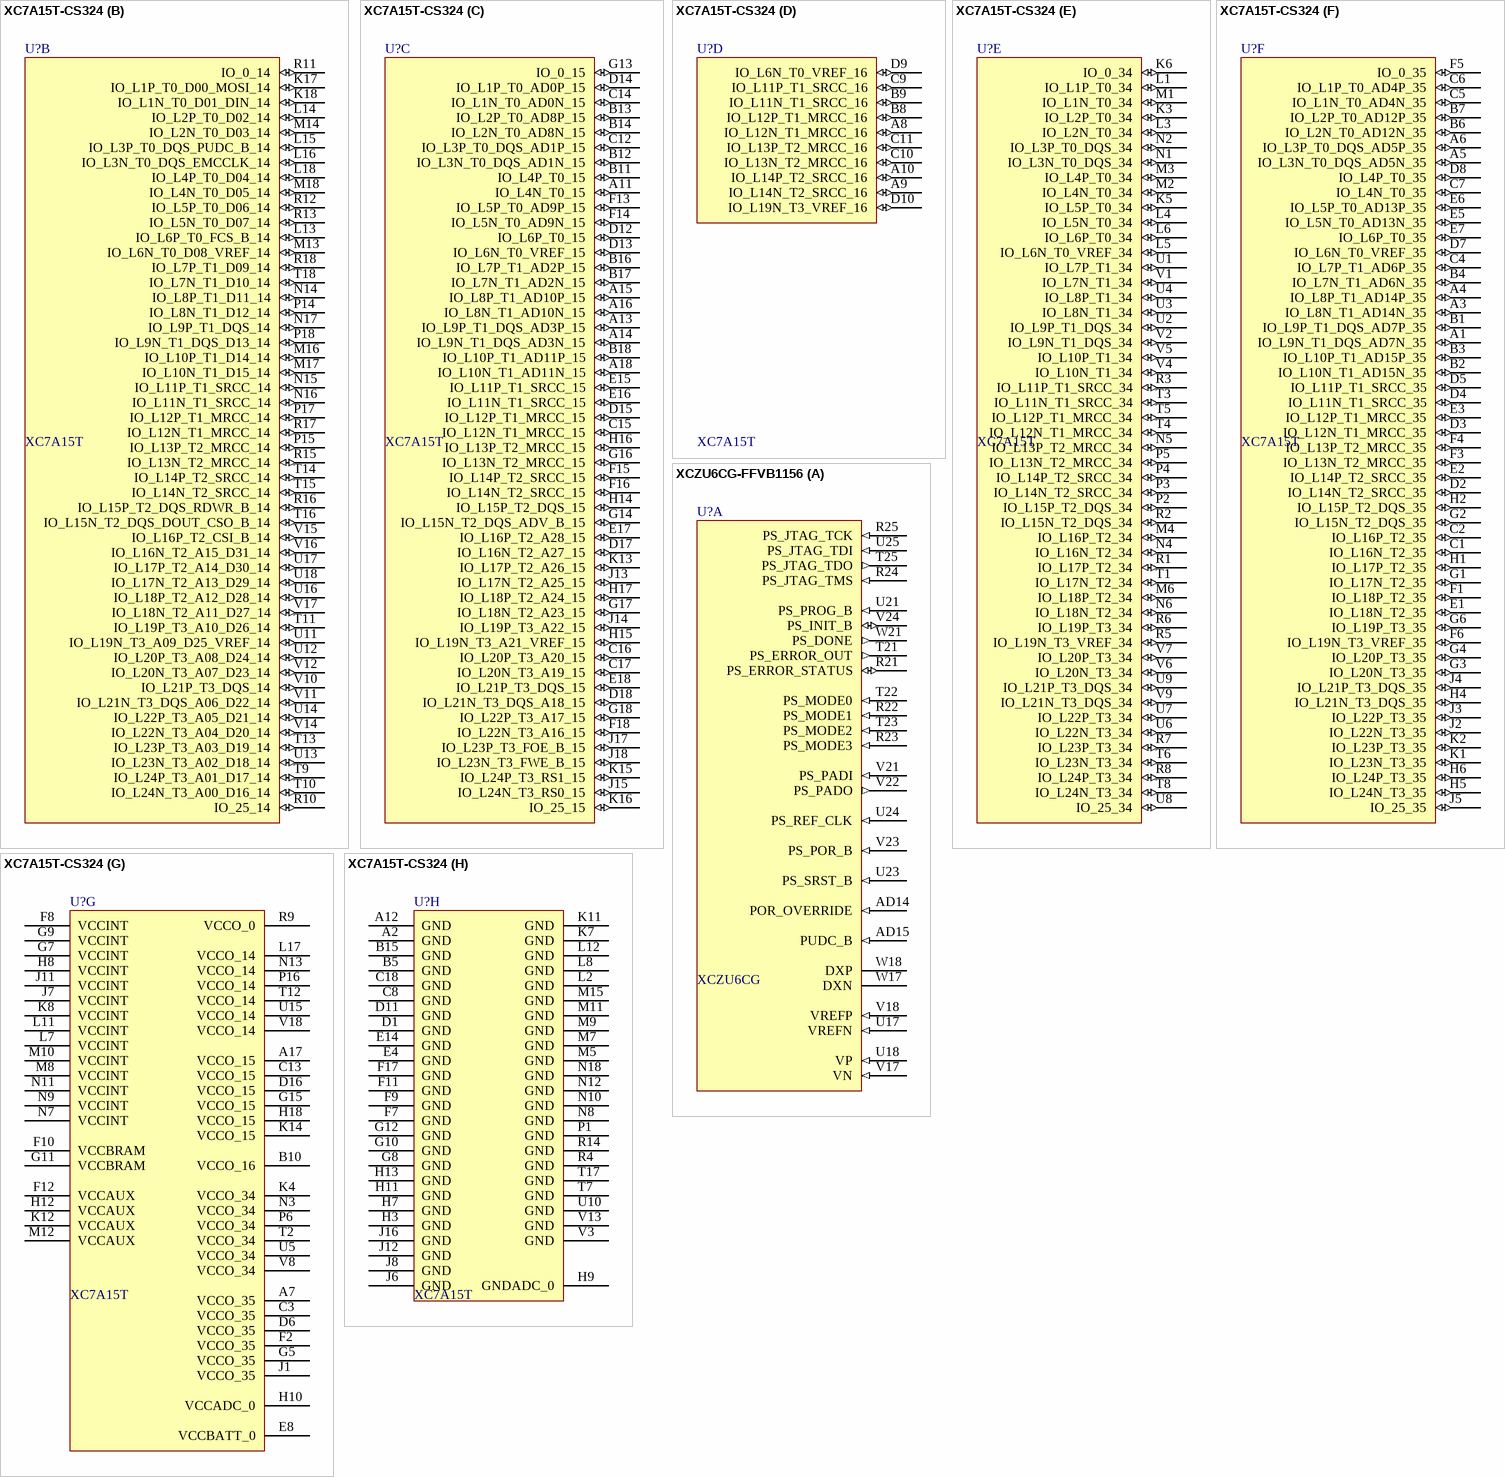
[diagram p15: symbols XC7A15T-CS324 to XCZU6CG-FFVB1156]